# Altium footprint library CATS-Vega.PcbLib: 42 footprints (part 3 of 3)
Each footprint in its own frame and in the unit in brackets; x right, y up, seen from the top. Pads: shape width x height; smd on the part's side, far side on the other; paste and mask are expansions set on the pad; w line width, h text height; cw(c..) or ccw(c..) is an arc to the next point about the centre after c.
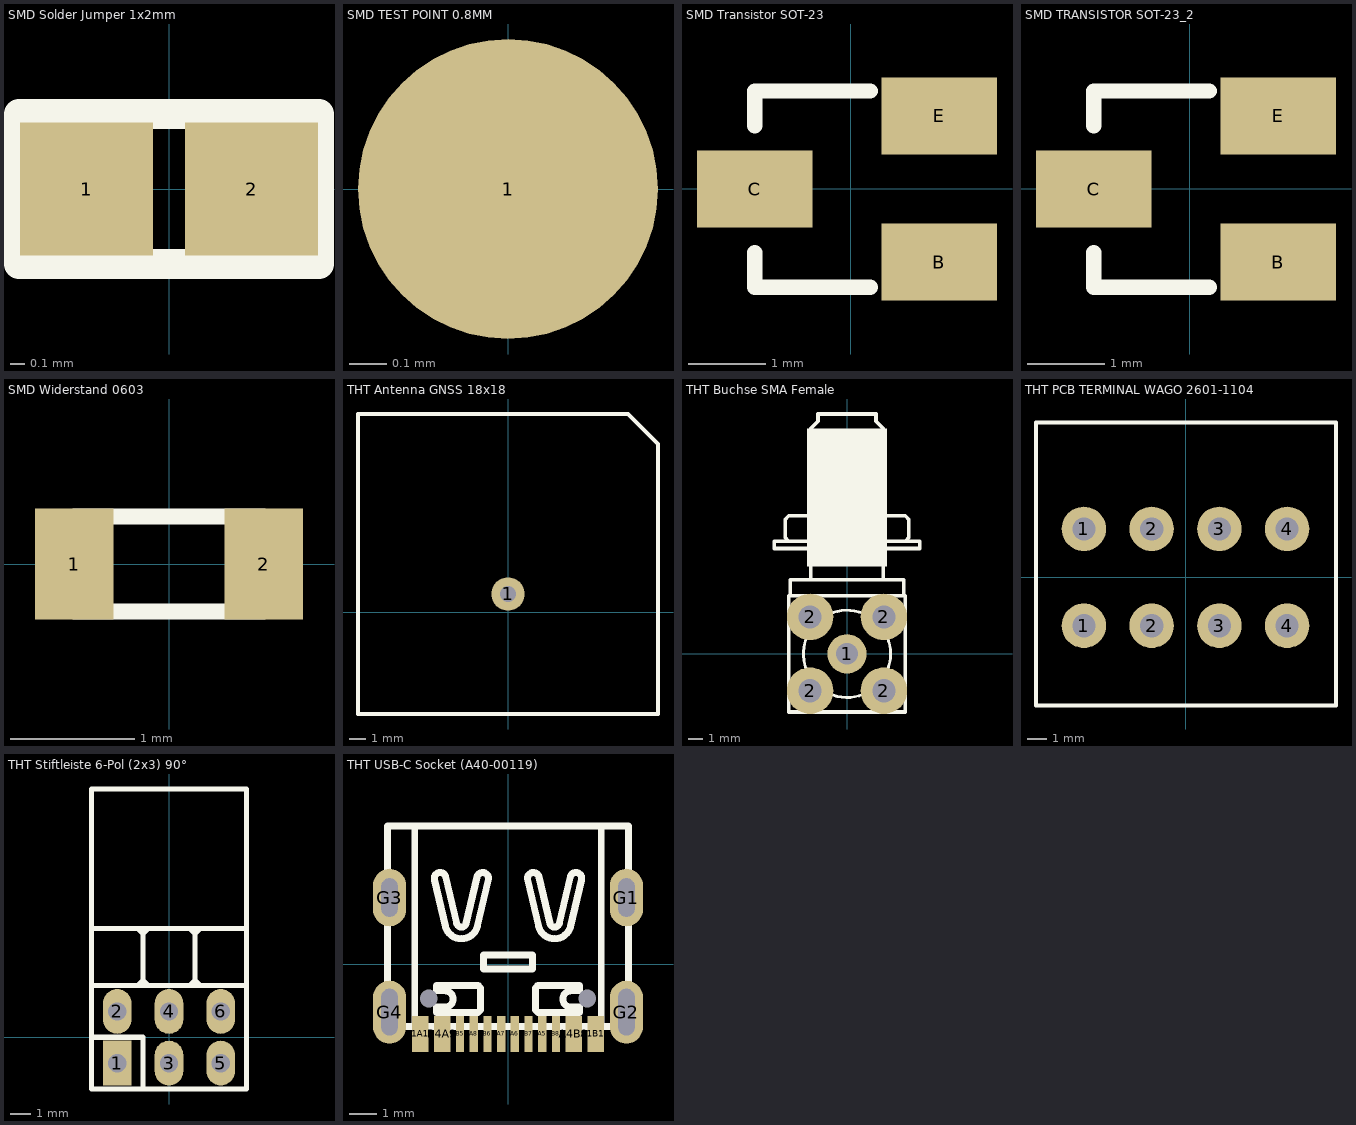
[diagram p2: the footprints below, top view; thin cyan lines are the x and y axes]

## SMD Solder Jumper 1x2mm [mm] "SOT-223/SC-73; 4 Leads; Body 6.7 x 7.3 mm, inc. leads (LxW max)"
height 1.8
pads (2):
  rect 0.9x0.9 smd paste-2539.97: 1(-0.559,0) 2(0.559,0)
Top Overlay:
  lines w0.2: -1.016,-0.508 -1.016,0.508 1.016,0.508 1.016,-0.508 -1.016,-0.508

## SMD TEST POINT 0.8MM [mm]
pads (1):
  round 0.8 smd paste-10: 1(0,0)

## SMD Transistor SOT-23 [mm]
height 1.7
pads (3):
  rect 1.5x1 smd: B(1.149,-0.95) C(-1.251,0) E(1.149,0.95)
Top Overlay:
  lines w0.2: -1.251,-0.826 -1.251,-1.276 0.249,-1.276 ; -1.251,0.824 -1.251,1.274 0.249,1.274
3D body "CircuitWorks-SOT-23.step": height 1.1, standoff 0, extent -1.25,-1.5 1.25,1.5

## SMD TRANSISTOR SOT-23_2 [mm]
pads (3):
  rect 1.5x1 smd: B(1.149,-0.95) C(-1.251,0) E(1.149,0.95)
Top Overlay:
  lines w0.2: -1.251,-0.826 -1.251,-1.276 0.249,-1.276 ; -1.251,0.824 -1.251,1.274 0.249,1.274
3D body "CircuitWorks-SOT-23.step": height 1.1, standoff 0, extent -1.25,-1.5 1.25,1.5

## SMD Widerstand 0603 [mil]
height 66.93
pads (2):
  rect 25x35 smd: 1(-30,0) 2(30,0)
Top Overlay:
  lines w5: -30,-15 -30,15 30,15 30,-15 -30,-15
3D body "User Library-Panasonic0603.step": height 17.72, standoff 0, extent -31.5,-16.14 31.5,16.14

## THT Antenna GNSS 18x18 [mm]
height 1.7
pads (1):
  round 2 hole 0.95: 1(0,1.1)
Top Overlay:
  lines w0.254: -9,-6.1 -9,11.9 7.2,11.9 9,10.1 9,-6.1 -9,-6.1
3D body "APAE1575R1820ABDC1-T.STEP": height 2.6, standoff -3, extent -9,-8.2 9,11.8

## THT Buchse SMA Female [mm]
height 1.7
pads (5):
  round 2.7 hole 1.5: 1(0,0)
  round 3.2 hole 1.6: 2(-2.54,-2.54) 2(-2.54,2.54) 2(2.54,-2.54) 2(2.54,2.54)
Top Overlay:
  circle w0.203: c0,0 r3
  rectangle: -2.75,6 2.75,15.5
  lines w0.254: -4,7.75 -4.25,8 -4.25,9.25 -4,9.5 -2,9.5 ; -3,4 -3.9,4 -3.9,5.1 3.9,5.1 3.9,4 ; -2.75,7.75 -5,7.75 -5,7.25 5,7.25 5,7.75 2.75,7.75 ; -2.5,5.1 -2.5,15.5 -2,16 -2,16.5 2,16.5 2,16 2.5,15.5 2.5,5.1 ; 2,9.5 4,9.5 4.25,9.25 4.25,8 4,7.75 ; -4,-4 -4,4 4,4 4,-4 -4,-4
3D body "SMA-GoldNeu.STEP": height 11.5, standoff -3.89, extent -5.1,-4 5.1,16.5

## THT PCB TERMINAL WAGO 2601-1104 [mm]
pads (8):
  round 2.3 hole 1.2: 1(-5.25,-2.5) 1(-5.25,2.5) 2(-1.75,-2.5) 2(-1.75,2.5) 3(1.75,-2.5) 3(1.75,2.5) 4(5.25,-2.5) 4(5.25,2.5)
Top Overlay:
  lines w0.203: -7.725,-6.625 7.775,-6.625 7.775,8 -7.725,8 -7.725,-6.625
3D body "2601-1104.stp": height 12.75, standoff -3.6, extent -7.825,-6.625 7.675,9.955

## THT Stiftleiste 6-Pol (2x3) 90° [mm]
height 1.7
pads (6):
  rect 1.4x2.2 hole 0.9: 1(-2.54,-1.27)
  oval 1.4x2.2 hole 0.9: 2(-2.54,1.27) 3(0,-1.27) 4(0,1.27) 5(2.54,-1.27) 6(2.54,1.27)
Top Overlay:
  lines w0.254: -3.81,0 -1.27,0 -1.27,-2.54 ; -3.81,5.334 3.81,5.334 ; -1.524,2.54 -1.27,2.794 ; -1.524,5.334 -1.27,5.08 ; -1.016,2.54 -1.27,2.794 ; -1.016,5.334 -1.27,5.08 ; 1.016,2.54 1.27,2.794 ; 1.016,5.334 1.27,5.08 ; 1.524,2.54 1.27,2.794 ; 1.524,5.334 1.27,5.08 ; -3.81,2.54 -3.81,12.192 3.81,12.192 3.81,2.54 ; -3.81,2.54 3.81,2.54 ; -3.81,2.54 -3.81,-2.54 3.81,-2.54 3.81,2.54 ; -1.27,2.794 -1.27,5.08 ; -1.27,2.794 -1.27,5.08 ; 1.27,2.794 1.27,5.08 ; 1.27,2.794 1.27,5.08
3D body "Pin Header 2x3 TH Angle Pitch 2.54mm.stp": height 5.63, standoff -3.2, extent -3.81,-1.585 3.81,12.153

## THT USB-C Socket (A40-00119) [mm]
height 1.7
pads (18):
  rect 0.6x1.3 smd: A1B12(3.2,-2.55) A4B9(2.4,-2.55) B1A12(-3.2,-2.55) B4A9(-2.4,-2.55)
  rect 0.3x1.3 smd: A5(1.25,-2.55) A6(0.25,-2.55) A7(-0.25,-2.55) A8(-1.25,-2.55) B5(-1.75,-2.55) B6(-0.75,-2.55) B7(0.75,-2.55) B8(1.75,-2.55)
  oval 1.2x2.1 hole 0.6 slot 1.4 at 90 deg: G1(4.32,2.425) G3(-4.32,2.425)
  oval 1.2x2.3 hole 0.6 slot 1.7 at 90 deg: G2(4.32,-1.755) G4(-4.32,-1.755)
  round 0 hole 0.65 unplated: NC(-2.89,-1.255) NC(2.89,-1.255)
Top Overlay:
  lines w0.254: -3.5,5.025 -3.4,5.025 -3.4,-2.275 ; 3.4,-2.275 3.4,5.025 3.5,5.025 ; -4.4,-2.275 0,-2.275 4.4,-2.275 4.4,5.025 4.375,5.025 0,5.025 -4.375,5.025 -4.4,5.025 -4.4,-2.275 ; -2.68,3.06 cw(c-2.476,3.123) -2.27,3.175 -1.871,1.478 ccw(c-1.7,1.525) -1.7,1.348 ccw(c-1.7,1.525) -1.529,1.478 -1.13,3.175 cw(c-0.924,3.123) -0.72,3.06 -1.12,1.363 cw(c-1.7,1.525) -1.7,0.923 cw(c-1.7,1.525) -2.28,1.363 -2.68,3.06 ; -2.6,-1.775 -2.6,-1.575 -2.3,-1.575 ccw(c-2.3,-1.275) -2,-1.275 ccw(c-2.3,-1.275) -2.3,-0.975 -2.6,-0.975 -2.6,-0.775 -1.1,-0.775 -1,-0.875 -1,-1.675 -1.1,-1.775 -2.6,-1.775 ; -0.9,-0.175 0,-0.175 0.9,-0.175 0.9,0.325 0,0.325 -0.9,0.325 -0.9,-0.175 ; 0.72,3.06 cw(c0.924,3.123) 1.13,3.175 1.529,1.478 ccw(c1.7,1.525) 1.7,1.348 ccw(c1.7,1.525) 1.871,1.478 2.27,3.175 cw(c2.476,3.123) 2.68,3.06 2.28,1.363 cw(c1.7,1.525) 1.7,0.923 cw(c1.7,1.525) 1.12,1.363 0.72,3.06 ; 1,-1.675 1.1,-1.775 2.6,-1.775 2.6,-1.575 2.3,-1.575 cw(c2.3,-1.275) 2,-1.275 cw(c2.3,-1.275) 2.3,-0.975 2.6,-0.975 2.6,-0.775 1.1,-0.775 1,-0.875 1,-1.675
3D body "USB - C.x_t": height 3.26, standoff -1, extent -4.475,-2.794 4.475,4.956